# Altium footprint library CustomCase.PcbLib: 281 footprints (part 14 of 18)
Each footprint in its own frame and in the unit in brackets; x right, y up, seen from the top. Pads: shape width x height; smd on the part's side, far side on the other; paste and mask are expansions set on the pad; w line width, h text height; cw(c..) or ccw(c..) is an arc to the next point about the centre after c.
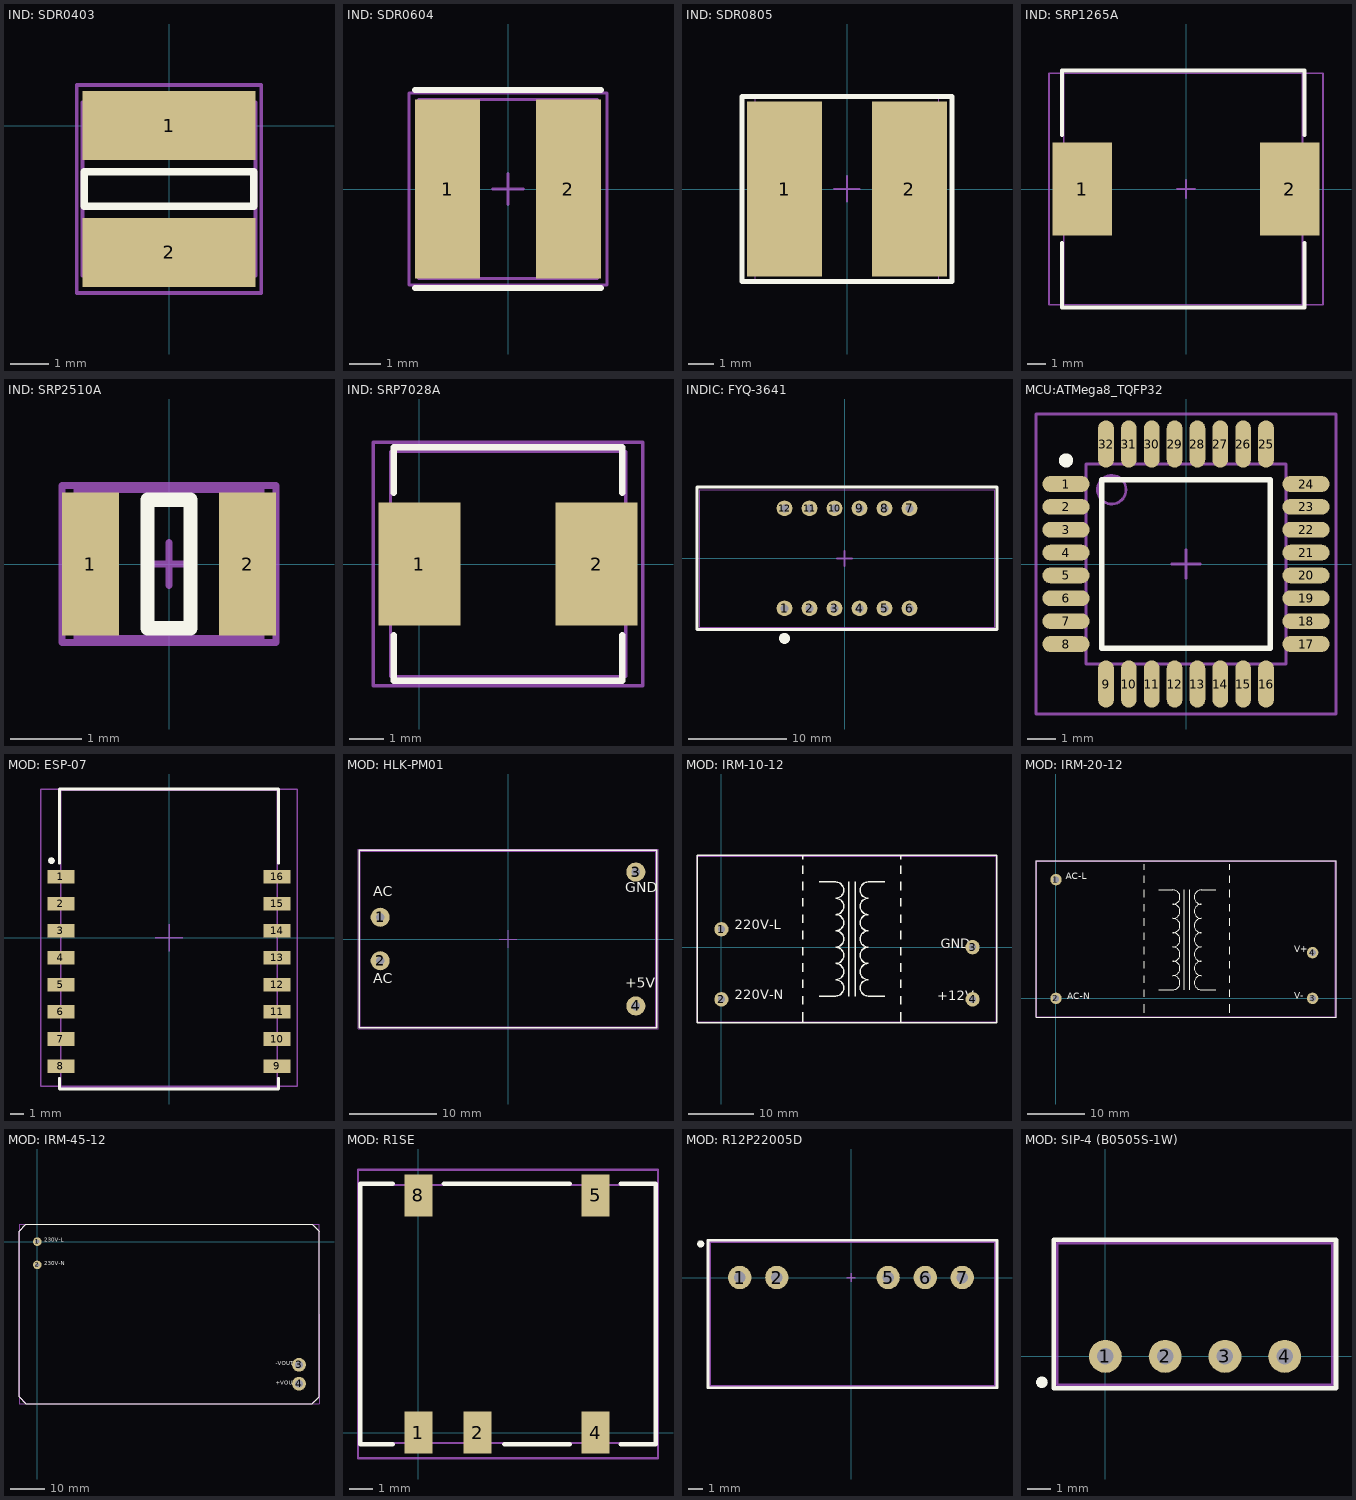
[diagram p13: the footprints below, top view; thin cyan lines are the x and y axes]

## IND: SDR0403 [mm]
pads (2):
  rect 4.5x1.8 smd: 1(0,0) 2(0,-3.3)
Top Overlay:
  lines w0.2: -2.2,-2.1 -2.2,-1.2 2.2,-1.2 2.2,-2.1 -2.2,-2.1
Top Assy:
  lines w0.1: -2.25,-3.9 2.25,-3.9 2.25,0.6 -2.25,0.6 -2.25,0.25 -2.25,-3.9
Border:
  lines w0.1: -2.4,-4.35 -2.4,1.05 2.4,1.05 2.4,-4.35 -2.4,-4.35
3D body "User Library-SDR0403.STEP": height 3.5, standoff 0, extent -2.25,-3.9 2.25,0.6

## IND: SDR0604 [mm]
pads (2):
  rect 2.1x5.8 smd: 1(-1.95,0) 2(1.95,0)
Top Overlay:
  lines w0.2: -3,-3.2 3,-3.2 ; -3,3.2 3,3.2
Top Assy:
  lines w0.1: -2.9,-2.9 -2.9,2.9 2.9,2.9 2.9,-2.9 -2.9,-2.9
Border:
  lines w0.1: -0.5,0 0.5,0 ; 0,-0.5 0,0.5 ; -3.2,-3.1 -3.2,3.1 3.2,3.1 3.2,-3.1 -3.2,-3.1
3D body "SDR0604.STEP": height 4.8, standoff 0, extent -2.9,-2.9 2.9,2.9

## IND: SDR0805 [mm]
height 5.3
pads (2):
  rect 3x7 smd: 1(-2.5,0) 2(2.5,0)
Top Overlay:
  lines w0.2: -4.2,-3.7 -4.2,3.7 4.2,3.7 4.2,-3.7 -4.2,-3.7
Top Assy:
  lines w0.05: -3.675,-3.75 -3.675,3.75 3.675,3.75 3.675,-3.75 -3.675,-3.75
Border:
  lines w0.1: -0.5,0 0.5,0 ; 0,-0.5 0,0.5 ; -4.2,-3.7 4.2,-3.7 4.2,3.725 -4.2,3.725 -4.2,-3.7
3D body "SDR0805.STEP": height 5.08, standoff 0.03, extent -3.677,-3.75 3.677,3.75

## IND: SRP1265A [mm]
pads (2):
  rect 3.2x5 smd: 1(-5.6,0) 2(5.6,0)
Top Overlay:
  lines w0.2: -6.7,-2.9 -6.7,-6.4 6.4,-6.4 6.4,-2.9 ; -6.7,2.9 -6.7,6.4 6.4,6.4 6.4,2.9
Top Assy:
  lines w0.1: -6.6,-6.25 6.3,-6.25 6.3,6.25 -6.6,6.25 -6.6,-6.25
Border:
  lines w0.1: -0.5,0 0.5,0 ; 0,-0.5 0,0.5 ; -7.4,-6.25 7.4,-6.25 7.4,6.25 -7.4,6.25 -7.4,-6.25
3D body "SRP1265A series.stp": height 6.31, standoff 0, extent -6.6,-6.25 6.3,6.25

## IND: SRP2510A [mm]
pads (2):
  rect 0.8x2 smd: 1(-1.1,0) 2(1.1,0)
Top Overlay:
  lines w0.2: -0.3,-0.9 0.3,-0.9 0.3,0.9 -0.3,0.9 -0.3,-0.9
Top Assy:
  lines w0.1: -1.285,-1.045 1.285,-1.045 1.285,1.045 -1.285,1.045 -1.285,-1.045
Border:
  lines w0.1: -0.3,0 0.3,0 ; 0,-0.3 0,0.3 ; -1.5,-1.1 1.5,-1.1 1.5,1.1 -1.5,1.1 -1.5,-1.1
3D body "666.step": height 0.97, standoff 0.01, extent -1.285,-1.045 1.285,1.045

## IND: SRP7028A [mm]
pads (2):
  rect 2.4x3.6 smd: 1(0,0) 2(5.2,0)
Top Overlay:
  lines w0.2: -0.75,-2.1 -0.75,-3.425 5.95,-3.425 5.95,-2.1 ; -0.75,2.1 -0.75,3.425 5.95,3.425 5.95,2.1
Top Assy:
  lines w0.1: -0.847,-3.301 -0.847,3.299 6.053,3.299 6.053,-3.301 -0.847,-3.301
Border:
  lines w0.1: -1.35,-3.575 6.55,-3.575 6.55,3.575 -1.35,3.575 -1.35,-3.575
3D body "SRP 7028A series.STEP": height 2.83, standoff 0, extent -0.847,-3.301 6.053,3.299

## INDIC: FYQ-3641 [mm]
pads (12):
  round 1.6 hole 0.8: 1(-6.096,-5.08) 2(-3.556,-5.08) 3(-1.016,-5.08) 4(1.524,-5.08) 5(4.064,-5.08) 6(6.604,-5.08) 7(6.604,5.08) 8(4.064,5.08) 9(1.524,5.08) 10(-1.016,5.08) 11(-3.556,5.08) 12(-6.096,5.08)
Top Overlay:
  circle w0.6: c-6.096,-8.128 r0.254
  lines w0.3: -14.986,-7.239 15.494,-7.239 15.494,7.239 -14.986,7.239 -14.986,-7.239
Top Assy:
  lines w0.1: -14.732,-6.985 -14.732,6.985 15.24,6.985 15.24,-6.985 -14.732,-6.985
Border:
  lines w0.1: -14.986,-7.239 -14.986,7.239 15.494,7.239 15.494,-7.239 -14.986,-7.239
  lines w0.2: -0.762,0 0.762,0 ; 0,-0.762 0,0.762
3D body "User Library-IND 3641 RED.step": height 7.21, standoff -6.7, extent -14.746,-7 15.254,7

## MCU:ATMega8_TQFP32 [mm]
pads (32):
  oval 1.65x0.55 smd: 1(-4.2,2.8) 2(-4.2,2) 3(-4.2,1.2) 4(-4.2,0.4) 5(-4.2,-0.4) 6(-4.2,-1.2) 7(-4.2,-2) 8(-4.2,-2.8) 17(4.2,-2.8) 18(4.2,-2) 19(4.2,-1.2) 20(4.2,-0.4) 21(4.2,0.4) 22(4.2,1.2) 23(4.2,2) 24(4.2,2.8)
  oval 0.55x1.65 smd: 9(-2.8,-4.2) 10(-2,-4.2) 11(-1.2,-4.2) 12(-0.4,-4.2) 13(0.4,-4.2) 14(1.2,-4.2) 15(2,-4.2) 16(2.8,-4.2) 25(2.8,4.2) 26(2,4.2) 27(1.2,4.2) 28(0.4,4.2) 29(-0.4,4.2) 30(-1.2,4.2) 31(-2,4.2) 32(-2.8,4.2)
Top Overlay:
  circle w0.25: c-4.2,3.625 r0.125
  lines w0.2: -2.95,-2.95 -2.95,2.95 2.95,2.95 2.95,-2.95 -2.95,-2.95
3D model:
  circle w0.1: c-2.6,2.6 r0.5
  lines w0.1: -3.5,-3.5 -3.5,3.5 3.5,3.5 3.5,-3.5 -3.5,-3.5
Border:
  lines w0.1: -0.5,0 0.5,0 ; 0,-0.5 0,0.5 ; -5.25,-5.25 -5.25,5.25 5.25,5.25 5.25,-5.25 -5.25,-5.25
3D body "User Library-TQFP32-4.step": height 1.2, standoff 0.05, extent -4.524,-4.524 4.5,4.5

## MOD: ESP-07 [mm]
pads (17):
  rect 2x1 smd: 1(-8,4.5) 2(-8,2.5) 3(-8,0.5) 4(-8,-1.5) 5(-8,-3.5) 6(-8,-5.5) 7(-8,-7.5) 8(-8,-9.5) 9(8,-9.5) 10(8,-7.5) 11(8,-5.5) 12(8,-3.5) 13(8,-1.5) 14(8,0.5) 15(8,2.5) 16(8,4.5)
  round 0.5 on Top Overlay: ""(-8.7,5.7)
Top Overlay:
  lines w0.2: -8.1,-10.4 -8.1,-11.2 8.1,-11.2 8.1,-10.4 ; -8.1,5.5 -8.1,10.9 -8.1,11 8.1,11 8.1,5.5
Top Assy:
  lines w0.1: -8,-11.1 -8,10.9 8,10.9 8,-11.1 -8,-11.1
Border:
  lines w0.1: -1,0 1,0 ; 0,-1 0,1 ; -9.5,-11 9.5,-11 9.5,11 -9.5,11 -9.5,-11
3D body "User Library-ESP07-1.STEP": height 3.5, standoff -0.01, extent -8,-11.1 8,10.9

## MOD: HLK-PM01 [mm]
height 15
pads (4):
  round 2.2 hole 1: 1(-14.7,2.5) 2(-14.7,-2.5) 3(14.7,7.7) 4(14.7,-7.7)
Top Overlay:
  lines w0.2: -17.1,-10.2 -0.2,-10.2 17.1,-10.2 17.1,10.2 -17.1,10.2 -17.1,-10.2
  text "AC" at -15.5,4.5 h2
  text "AC" at -15.5,-5.5 h2
  text "+5V" at 13.5,-6 h2
  text "GND" at 13.5,5 h2
Top Assy:
  lines w0.1: -17,-10.1 17,-10.1 17,10.1 -17,10.1 -17,-10.1
Border:
  lines w0.1: -1,0 1,0 ; 0,-1 0,1 ; -17.25,-10.35 -17.25,10.35 17.25,10.35 17.25,-10.35 -17.25,-10.35
3D body "HLK-PM01.STEP": height 15.07, standoff -4.95, extent -17,-10.1 17,10.1

## MOD: IRM-10-12 [mm]
pads (4):
  round 2.2 hole 1.1: 1(0,2.75) 2(0,-8) 3(38.5,0) 4(38.5,-8)
Top Overlay:
  lines w0.2: 12.5,-11.5 12.5,-10 ; 12.5,-8.75 12.5,-7.5 ; 12.5,-6.25 12.5,-5 ; 12.5,-3.75 12.5,-2.5 ; 12.5,-1.25 12.5,0 ; 12.5,1.25 12.5,2.5 ; 12.5,3.75 12.5,5 ; 12.5,6.25 12.5,7.5 ; 12.5,8.75 12.5,10 ; 12.5,11.25 12.5,12.5 ; 12.5,13.5 12.5,14 ; 15,-7.5 17.5,-7.5 ccw(c17.5,-6.25) 17.5,-5 ccw(c17.5,-3.75) 17.5,-2.5 ccw(c17.5,-1.25) 17.5,0 ccw(c17.5,1.25) 17.5,2.5 ccw(c17.5,3.75) 17.5,5 ccw(c17.5,6.25) 17.5,7.5 ccw(c17.5,8.75) 17.5,10 15,10 ; 19.5,-7.5 19.5,10 ; 20.5,-7.5 20.5,10 ; 25,-7.5 22.5,-7.5 cw(c22.5,-6.25) 22.5,-5 cw(c22.5,-3.75) 22.5,-2.5 cw(c22.5,-1.25) 22.5,0 cw(c22.5,1.25) 22.5,2.5 cw(c22.5,3.75) 22.5,5 cw(c22.5,6.25) 22.5,7.5 cw(c22.5,8.75) 22.5,10 25,10 ; 27.5,-11.5 27.5,-10 ; 27.5,-8.75 27.5,-7.5 ; 27.5,-6.25 27.5,-5 ; 27.5,-3.75 27.5,-2.5 ; 27.5,-1.25 27.5,0 ; 27.5,1.25 27.5,2.5 ; 27.5,3.75 27.5,5 ; 27.5,6.25 27.5,7.5 ; 27.5,8.75 27.5,10 ; 27.5,11.25 27.5,12.5 ; 27.5,13.5 27.5,14 ; -3.75,-11.6 42.25,-11.6 42.25,14.1 -3.75,14.1 -3.75,-11.6
  text "220V-N" at 2,-8.5 h2.5
  text "220V-L" at 2,2.2 h2.5
  text "+12V" at 33.1,-8.7 h2.5
  text "GND" at 33.6,-0.7 h2.5
Top Assy:
  lines w0.1: -3.6,-11.45 -3.6,13.95 42.099,13.95 42.099,-11.45 -3.6,-11.45
Border:
  lines w0.1: -3.7,-11.55 42.2,-11.55 42.2,14.05 -3.7,14.05 -3.7,-11.55
3D body "User Library-IRM-10-12.STEP": height 22.05, standoff -3.5, extent -3.6,-11.45 42.099,13.95

## MOD: IRM-20-12 [mm]
pads (4):
  round 2 hole 1.1: 1(0,20.8) 2(0,0) 3(45,0) 4(45,8)
Top Overlay:
  lines w0.2: 15.5,-2.5 15.5,-1 ; 15.5,0.25 15.5,1.5 ; 15.5,2.75 15.5,4 ; 15.5,5.25 15.5,6.5 ; 15.5,7.75 15.5,9 ; 15.5,10.25 15.5,11.5 ; 15.5,12.75 15.5,14 ; 15.5,15.25 15.5,16.5 ; 15.5,17.75 15.5,19 ; 15.5,20.25 15.5,21.5 ; 15.5,22.5 15.5,23.5 ; 18,1.5 20.5,1.5 ccw(c20.5,2.75) 20.5,4 ccw(c20.5,5.25) 20.5,6.5 ccw(c20.5,7.75) 20.5,9 ccw(c20.5,10.25) 20.5,11.5 ccw(c20.5,12.75) 20.5,14 ccw(c20.5,15.25) 20.5,16.5 ccw(c20.5,17.75) 20.5,19 18,19 ; 22.5,1.5 22.5,19 ; 23.5,1.5 23.5,19 ; 28,1.5 25.5,1.5 cw(c25.5,2.75) 25.5,4 cw(c25.5,5.25) 25.5,6.5 cw(c25.5,7.75) 25.5,9 cw(c25.5,10.25) 25.5,11.5 cw(c25.5,12.75) 25.5,14 cw(c25.5,15.25) 25.5,16.5 cw(c25.5,17.75) 25.5,19 28,19 ; 30.5,-2.5 30.5,-1 ; 30.5,0.25 30.5,1.5 ; 30.5,2.75 30.5,4 ; 30.5,5.25 30.5,6.5 ; 30.5,7.75 30.5,9 ; 30.5,10.25 30.5,11.5 ; 30.5,12.75 30.5,14 ; 30.5,15.25 30.5,16.5 ; 30.5,17.75 30.5,19 ; 30.5,20.25 30.5,21.5 ; 30.5,22.5 30.5,23.5 ; -3.5,-3.3 -3.5,24.1 49.1,24.1 49.1,-3.3 -3.5,-3.3
  text "AC-L" at 1.7,20.4 h2
  text "AC-N" at 2,-0.6 h2
  text "V-" at 41.8,-0.5 h2
  text "V+" at 41.8,7.6 h2
Top Assy:
  lines w0.1: -3.4,-3.2 -3.4,24 49,24 49,-3.2 -3.4,-3.2
  text "AC-L" at 1.7,20.4 h2
  text "AC-N" at 2,-0.6 h2
  text "V-" at 41.8,-0.5 h2
  text "V+" at 41.8,7.6 h2
Border:
  lines w0.1: -3.5,-3.3 49.1,-3.3 49.1,24.1 -3.5,24.1 -3.5,-3.3
3D body "IRM-20-12.STEP": height 24, standoff -3, extent -3.4,-3.2 49,24

## MOD: IRM-45-12 [mm]
pads (4):
  round 2.5 hole 1.2: 1(0,0) 2(0,-6.75)
  round 4 hole 2.2: 3(76,-35.75) 4(76,-41.25)
Top Overlay:
  lines w0.2: -5.3,3 -5.3,3 ; -5.3,3 -3.3,5 79.8,5 81.8,3 81.8,-45.05 79.8,-47.05 -3.3,-47.05 -5.3,-45.05 -5.3,3
  text "230V-N" at 2,-7.25 h2
  text "230V-L" at 2,-0.5 h2
  text "+VOUT" at 69.25,-42 h2
  text "-VOUT" at 69.25,-36.25 h2
Top Assy:
  lines w0.1: -5.3,-45.05 -5.3,3 -3.3,5 79.8,5 81.8,3 81.8,-45.05 79.75,-47.1 -3.25,-47.1 -5.3,-45.05
  text "230V-L" at 2,-0.5 h2
  text "230V-N" at 2,-7.25 h2
  text "+VOUT" at 69.25,-42 h2
  text "-VOUT" at 69.25,-36.25 h2
Border:
  lines w0.1: -5.3,-47.1 81.8,-47.1 81.8,5.1 -5.3,5.1 -5.3,-47.1
3D body "IRM-45-15.step": height 29.51, standoff -3.5, extent -5.25,-47 81.75,5

## MOD: R1SE [mm]
pads (5):
  rect 1.2x1.8 smd: 1(0,0) 2(2.54,0) 4(7.62,0) 5(7.62,10.2) 8(0,10.2)
Top Overlay:
  lines w0.2: -1.1,-0.5 -2.5,-0.5 -2.5,10.7 -1.1,10.7 ; 1.1,10.7 6.5,10.7 ; 3.7,-0.5 6.5,-0.5 ; 8.7,-0.5 10.2,-0.5 10.2,10.7 8.7,10.7
Top Assy:
  lines w0.1: -2.525,-0.45 -2.525,10.65 10.225,10.65 10.225,-0.45 -2.525,-0.45
Border:
  lines w0.1: -2.6,-1.1 10.3,-1.1 10.3,11.3 -2.6,11.3 -2.6,-1.1
3D body "User Library-RECOM_R1S-xxxx.STEP": height 7, standoff 0, extent -2.525,-0.45 10.225,10.65

## MOD: R12P22005D [mm]
pads (6):
  round 1.6 hole 0.8: 1(-7.62,0) 2(-5.08,0) 5(2.54,0) 6(5.08,0) 7(7.62,0)
  round 0.5 on Top Overlay: ""(-10.3,2.3)
Top Overlay:
  lines w0.2: -9.8,-7.55 10,-7.55 10,2.55 -9.8,2.55 -9.8,-7.55
Top Assy:
  lines w0.1: -9.65,-7.4 9.85,-7.4 9.85,2.4 -9.65,2.4 -9.65,-7.4
Border:
  lines w0.1: -0.3,0 0.3,0 ; 0,-0.3 0,0.3 ; -9.75,-7.5 9.95,-7.5 9.95,2.5 -9.75,2.5 -9.75,-7.5
3D body "SIP-7 (19.5x9.8x12.5).STEP": height 12.51, standoff -4.09, extent -9.65,-7.4 9.85,2.4

## MOD: SIP-4 (B0505S-1W) [mm]
pads (5):
  round 1.4 hole 0.7: 1(0,0) 2(2.54,0) 3(5.08,0) 4(7.62,0)
  round 0.5 on Top Overlay: ""(-2.7,-1.1)
Top Overlay:
  lines w0.2: -2.2,-1.35 9.8,-1.35 9.8,4.95 -2.2,4.95 -2.2,-1.35
Top Assy:
  lines w0.1: -2.042,-1.2 9.642,-1.2 9.642,4.8 -2.042,4.8 -2.042,-1.2
Border:
  lines w0.1: -2.15,-1.3 9.75,-1.3 9.75,4.9 -2.15,4.9 -2.15,-1.3
3D body "User Library-4-Lead SIP_AM1S-1205SZ_Aimtec_DC-DC_Converter_1_Watt.STEP": height 10.2, standoff -3, extent -2.042,-1.2 9.642,4.8